# Altium footprint library THU VIEN PCB.PCBLib: 911 footprints (part 25 of 57)
Each footprint in its own frame and in the unit in brackets; x right, y up, seen from the top. Pads: shape width x height; smd on the part's side, far side on the other; paste and mask are expansions set on the pad; w line width, h text height; cw(c..) or ccw(c..) is an arc to the next point about the centre after c.
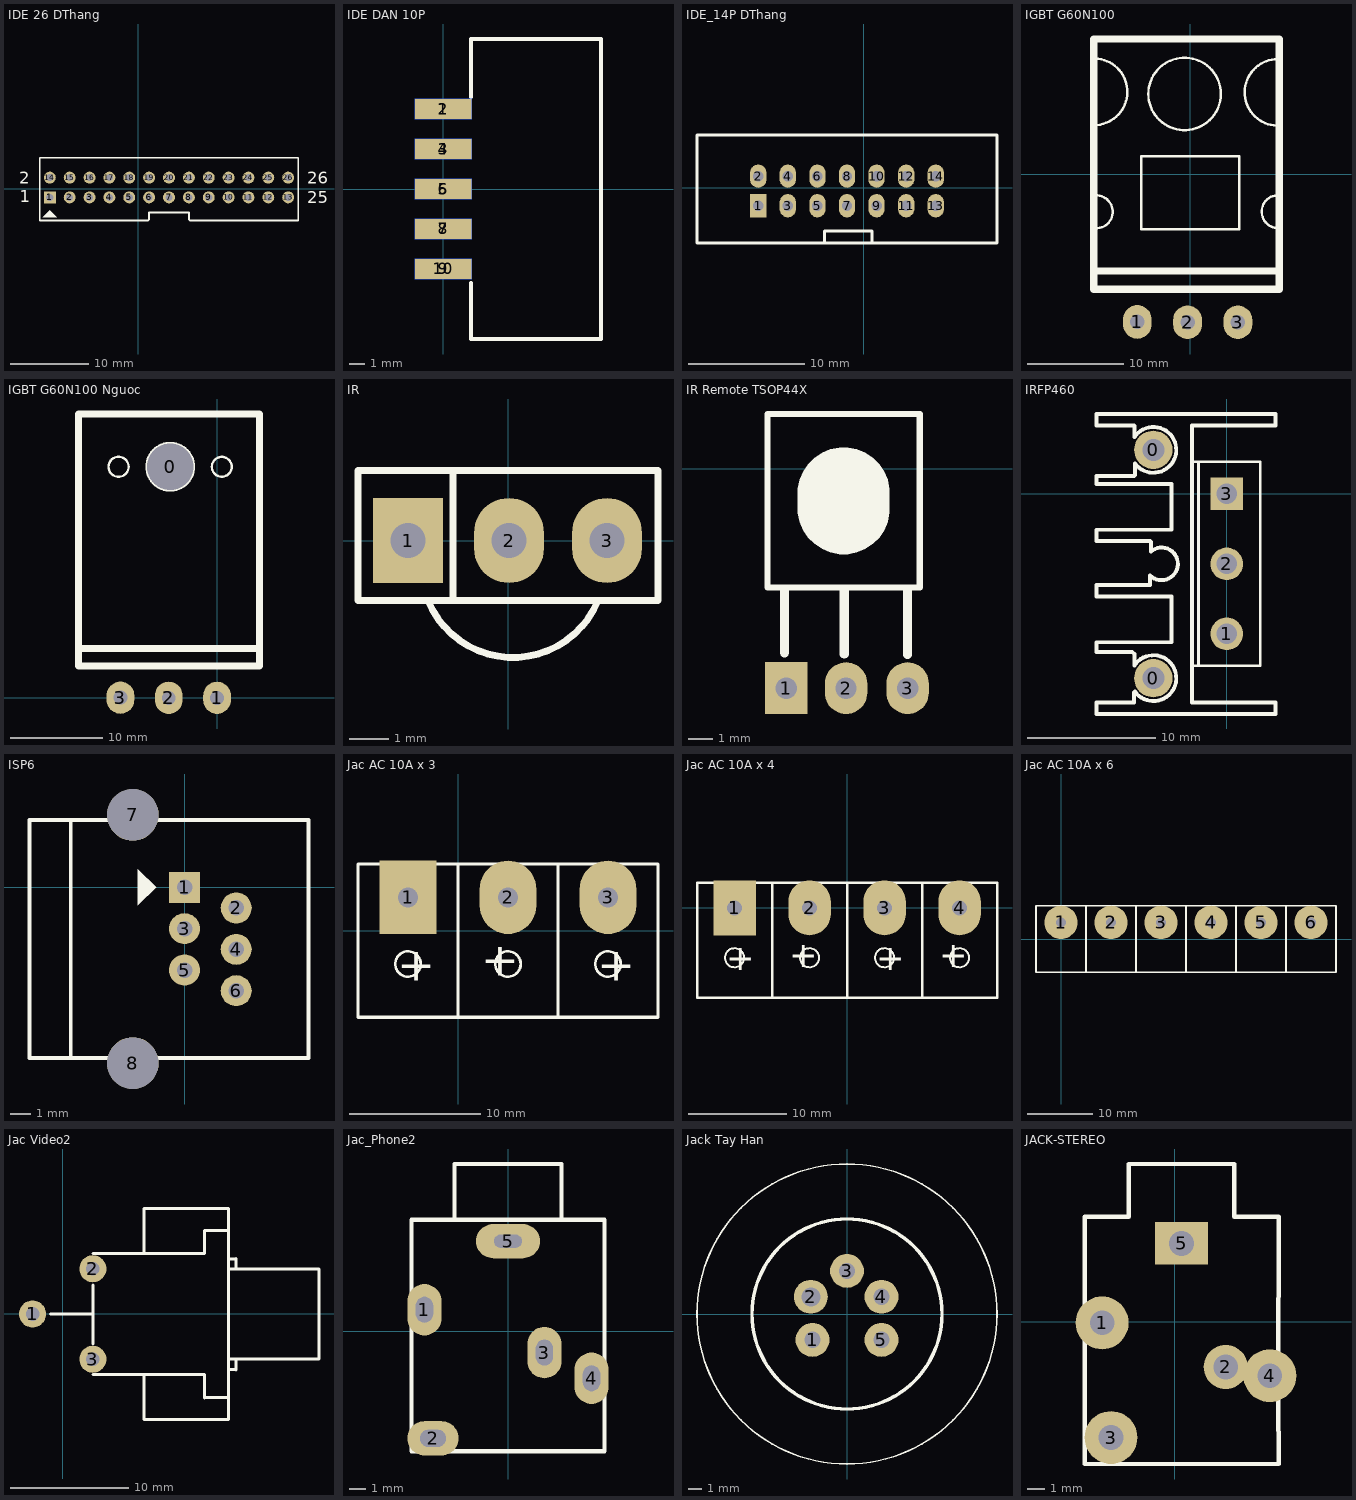
[diagram p24: the footprints below, top view; thin cyan lines are the x and y axes]

## IDE 26 DThang [mil]
pads (26):
  rect 60x60 hole 36: 1(-445,-45)
  round 60 hole 36: 2(-345,-45) 3(-245,-45) 4(-145,-45) 5(-45,-45) 6(55,-45) 7(155,-45) 8(255,-45) 9(355,-45) 10(455,-45) 11(555,-45) 12(655,-45) 13(755,-45) 14(-445,55) 15(-345,55) 16(-245,55) 17(-145,55) 18(-45,55) 19(55,55) 20(155,55) 21(255,55) 22(355,55) 23(455,55) 24(555,55) 25(655,55) 26(755,55)
Top Overlay:
  region: -445,-110 -480,-145 -410,-145
  lines w8: -495,-160 -495,155 805,155 805,-160
  lines w10: -495,-160 50,-160 55,-155 55,-120 255,-120 255,-155 260,-160 805,-160
  text "1" at -595,-70 h60
  text "2" at -600,25 h60
  text "25" at 850,-75 h60
  text "26" at 850,25 h60

## IDE DAN 10P [mm]
pads (10):
  rect 3.6x1.3 smd: 1(0,5.08) 3(0,2.54) 5(0,0) 7(0,-2.54) 9(0,-5.08)
  rect 3.6x1.3 smd far side: 2(0,5.08) 4(0,2.54) 6(0,0) 8(0,-2.54) 10(0,-5.08)
Top Overlay:
  lines w0.254: 1.778,-5.969 1.778,-9.525 10.033,-9.525 10.033,9.525 1.778,9.525 1.778,5.842

## IDE_14P DThang [mm]
pads (14):
  rect 1.4x2 hole 0.9: 1(-9.068,-1.549)
  oval 1.4x2 hole 0.9: 2(-9.068,0.991) 3(-6.528,-1.549) 4(-6.528,0.991) 5(-3.988,-1.549) 6(-3.988,0.991) 7(-1.448,-1.549) 8(-1.448,0.991) 9(1.092,-1.549) 10(1.092,0.991) 11(3.632,-1.549) 12(3.632,0.991) 13(6.172,-1.549) 14(6.172,0.991)
Top Overlay:
  lines w0.254: -3.374,-4.748 -3.374,-3.712 0.69,-3.712 0.69,-4.748 ; -14.326,-4.75 11.43,-4.75 11.43,4.521 -14.326,4.521 -14.326,-4.75

## IGBT G60N100 [mm]
pads (3):
  oval 3x3.5 hole 1.5: 1(-5.512,-15.342) 2(-0.279,-15.367) 3(4.953,-15.367)
Top Overlay:
  circle w0.254: c-0.595,8.382 r3.77
  lines w0.254: -10.014,5.134 ccw(c-10.014,8.6) -9.906,12.065 ; -9.66,-2.179 cw(c-9.774,-3.884) -9.652,-5.588 ; 9.017,-2.159 ccw(c9.139,-3.863) 9.025,-5.568 ; 9.017,5.08 cw(c9.125,8.545) 9.125,12.011 ; -5.08,-5.715 -5.08,1.905 5.08,1.905 5.08,-5.715 -5.08,-5.715
  lines w0.762: -10.033,-10.033 9.017,-10.033 ; -10.033,-11.938 -10.033,14.097 9.271,14.097 9.271,-11.938 -10.033,-11.938

## IGBT G60N100 Nguoc [mm]
pads (4):
  round 4 hole 5: 0(-5.08,25.019)
  oval 3x3.5 hole 1.5: 1(0,0) 2(-5.232,0) 3(-10.465,0.025)
Top Overlay:
  circle w0.254: c-10.668,25.019 r1.085
  circle w0.254: c0.508,25.019 r1.078
  circle w0.254: c-5.08,25.019 r2.572
  lines w0.762: -14.986,5.334 4.572,5.334 ; -14.986,3.429 4.572,3.429 4.572,30.734 -14.986,30.734 -14.986,3.429
3D body "TO_264 H.step": height 5.22, standoff -12.88, extent -15.494,-0.272 5.006,31.006

## IR [mil] "Receiver Infared IC"
height 200
pads (3):
  rect 70x85 hole 35: 1(-100,0)
  oval 70x85 hole 35: 2(1,0) 3(99,0)
Top Overlay:
  lines w7: -80,-60 ccw(c5,-25) 90,-60 ; -55,-60 -55,70 ; -150,-60 150,-60 150,70 -150,70 -150,-60
3D body "IR Remote TSOP44x.STEP": height 444.47, standoff -94.36, extent -118.11,-190 118.11,156.83

## IR Remote TSOP44X [mil]
pads (3):
  rect 70x85 hole 35: 1(-419,-360)
  oval 70x85 hole 35: 2(-321,-360) 3(-220,-360)
Top Overlay:
  region: -250,-40 -250,-65 -250,-72.39 -252.88,-86.88 -258.54,-100.53 -266.74,-112.81 -277.19,-123.26 -289.47,-131.46 -303.12,-137.12 -317.61,-140 -325,-140 -332.39,-140 -346.88,-137.12 -360.53,-131.46 -372.81,-123.26 -383.26,-112.81 -391.46,-100.53 -397.12,-86.88 -400,-72.39 -400,-65 -400,-40 -400,-32.61 -397.12,-18.12 -391.46,-4.47 -383.26,7.81 -372.81,18.26 -360.53,26.46 -346.88,32.12 -332.39,35 -325,35 -317.61,35 -303.12,32.12 -289.47,26.46 -277.19,18.26 -266.74,7.81 -258.54,-4.47 -252.88,-18.12 -250,-32.61
  lines w10: -450,-195 -450,90 -200,90 -200,-195 -450,-195
  lines w15: -422,-302 -422,-200 ; -324,-304 -324,-200 ; -220,-305 -220,-200
3D body "IR Remote TSOP44x.STEP": height 205.96, standoff -100.56, extent -438.1,-424.14 -201.88,91.82

## IRFP460 [mm]
pads (5):
  round 3 hole 1.7: 0(-5.715,-14.351) 0(-5.715,3.429)
  round 2.54 hole 1.6: 1(0,-10.9) 2(0,-5.45)
  rect 2.54x2.54 hole 1.6: 3(0,0)
Top Overlay:
  lines w0.2: -2.2,-13.4 -2.2,2.5 ; -2.7,-13.4 2.6,-13.4 2.6,2.5 -2.7,2.5 -2.7,-13.4
  lines w0.305: -2.7,2.159 -2.7,5.334 3.81,5.334 3.81,6.223 -10.16,6.223 -10.16,5.334 -7.239,5.334 -7.198,5.293 -7.198,4.418 cw(c-5.715,3.429) -7.157,2.381 -7.157,1.479 -7.239,1.397 -8.382,1.397 -10.16,1.397 -10.16,0.762 -4.318,0.762 -4.318,-2.794 -10.16,-2.794 -10.16,-3.683 -5.969,-3.683 -5.9,-3.752 -5.9,-4.48 cw(c-5.08,-5.45) -5.972,-6.354 -5.972,-7.109 -5.969,-7.112 -10.16,-7.112 -10.16,-8.001 -4.318,-8.001 -4.318,-11.557 -10.16,-11.557 -10.16,-12.319 -7.366,-12.319 -7.198,-12.487 -7.198,-13.362 cw(c-5.715,-14.351) -7.157,-15.399 -7.239,-15.482 -7.239,-16.256 -10.16,-16.256 -10.16,-17.145 3.81,-17.145 3.81,-16.256 -2.7,-16.256 -2.7,3.048

## ISP6 [mil] "Jac nap PIC"
pads (8):
  rect 60x60 hole 30: 1(0,0)
  round 60 hole 30: 2(100,-40) 3(0,-80) 4(100,-120) 5(0,-160) 6(100,-200)
  round 100 hole 100: 7(-100,140) 8(-100,-340)
Top Overlay:
  region: -55,0 -90,35 -90,-35
  lines w7: -220,-330 -220,130
  lines w8: -300,-330 -300,130 240,130 240,-330 -300,-330

## Jac AC 10A x 3 [mil] "Jac nguon 220V 10A"
pads (3):
  rect 170x220 hole 60: 1(-150,100)
  oval 170x220 hole 60: 2(150,100) 3(450,100)
Top Overlay:
  circle w8: c450,-100 r38.08
  circle w8: c150,-100 r38.08
  circle w8: c-150,-100 r38.08
  lines w10: 0,-260 0,200 ; 300,-260 600,-260 600,200 300,200 ; 300,-260 300,200 ; 300,-260 -300,-260 -300,200 300,200 ; 300,-260 300,-200 ; 300,-200 300,200 ; 300,-200 300,200
  text "+" at 417,-150 h100
  text "+" at 183,-50 h100
  text "+" at -183,-150 h100

## Jac AC 10A x 4 [mil] "Jac nguon 220V 10A"
pads (4):
  rect 170x220 hole 60: 1(-450,0)
  oval 170x220 hole 60: 2(-150,0) 3(150,0) 4(450,0)
Top Overlay:
  circle w8: c-450,-200 r38.08
  circle w8: c-150,-200 r38.08
  circle w8: c150,-200 r38.08
  circle w8: c450,-200 r38.08
  lines w10: -300,-360 -300,100 ; 300,-360 300,100 ; 0,-360 0,-300 ; 0,-360 -600,-360 -600,100 0,100 ; 0,-360 0,100 ; 0,-360 600,-360 600,-300 ; 0,-300 0,100 ; 0,-300 0,100 ; 0,100 600,100 ; 600,-300 600,100 ; 600,-300 600,100
  text "+" at -483,-250 h100
  text "+" at -117,-150 h100
  text "+" at 117,-250 h100
  text "+" at 483,-150 h100

## Jac AC 10A x 6 [mil] "Jac nguon 220V 10A"
pads (6):
  round 200 hole 60: 1(0,100) 2(300,100) 3(600,100) 4(900,100) 5(1200,100) 6(1500,100)
Top Overlay:
  lines w10: 150,-200 150,200 ; 750,-200 750,200 ; 1350,-200 1350,200 ; 450,-200 1050,-200 ; 450,-200 450,200 ; 450,-200 450,200 ; 450,-200 -150,-200 -150,200 450,200 ; 450,200 1050,200 ; 1050,-200 1050,200 ; 1050,-200 1050,200 ; 1050,-200 1650,-200 1650,200 1050,200 ; 1050,-200 1050,200

## Jac Video2 [mil] "Jac Video Stereo"
pads (3):
  round 90 hole 45: 1(-100,0) 2(100,150) 3(100,-150)
Top Overlay:
  lines w10: -40,0 101,0 ; 100,-200 470,-200 ; 100,200 470,200 470,277 550,277 ; 101,-99 101,96 ; 270,200 270,350 550,350 ; 470,-277 548,-277 549,-276 ; 550,-277 550,-350 270,-350 ; 550,-150 850,-150 850,150 550,150 ; 551,-184 574,-184 575,-185 575,-151 ; 551,183 574,183 575,184 575,150 ; 270,-350 270,-200 270,-350 ; 470,-200 470,-278 470,-200 ; 550,277 550,350 ; 550,277 550,350 ; 550,-275 550,275 550,-275

## Jac_Phone2 [mil] "Jac Phone Stereo"
pads (5):
  oval 80x120 hole 40 slot 60 at 90 deg: 1(-195,50) 3(85,-50) 4(195,-110)
  oval 120x80 hole 40 slot 60 at 0 deg: 2(-175,-250)
  oval 150x80 hole 30 slot 65 at 0 deg: 5(0,210)
Top Overlay:
  lines w10: -125,262 -125,390 125,390 125,262 ; 223,-280 -225,-280 ; -225,-280 -225,260 ; -225,-280 -225,260 ; -225,260 225,260 ; 225,260 225,-280 225,260

## Jack Tay Han [mm]
pads (5):
  round 2.5 hole 1.2: 1(-2.54,-1.905) 3(0,3.175) 4(2.54,1.27) 5(2.54,-1.905)
  round 2.5 hole 1.4: 2(-2.667,1.27)
Top Overlay:
  circle w0.127: c0,0 r11.05
  circle w0.254: c0,0 r7

## JACK-STEREO [mm]
pads (5):
  round 3 hole 1.4: 1(-4.122,-0.061) 3(-3.622,-6.561) 4(5.378,-3.061)
  round 2.5 hole 1.4: 2(2.878,-2.561)
  rect 3x2.4 hole 1.4: 5(0.378,4.439)
Top Overlay:
  lines w0.254: 5.864,-4.35 5.878,-8.061 -5.122,-8.061 -5.122,4.439 -5.122,5.939 -2.625,5.939 -2.625,8.939 0.375,8.939 3.375,8.939 3.375,5.939 5.878,5.939 5.878,4.439 5.864,-1.708